# Altium footprint library pcb.PcbLib: 397 footprints (part 15 of 25)
Each footprint in its own frame and in the unit in brackets; x right, y up, seen from the top. Pads: shape width x height; smd on the part's side, far side on the other; paste and mask are expansions set on the pad; w line width, h text height; cw(c..) or ccw(c..) is an arc to the next point about the centre after c.
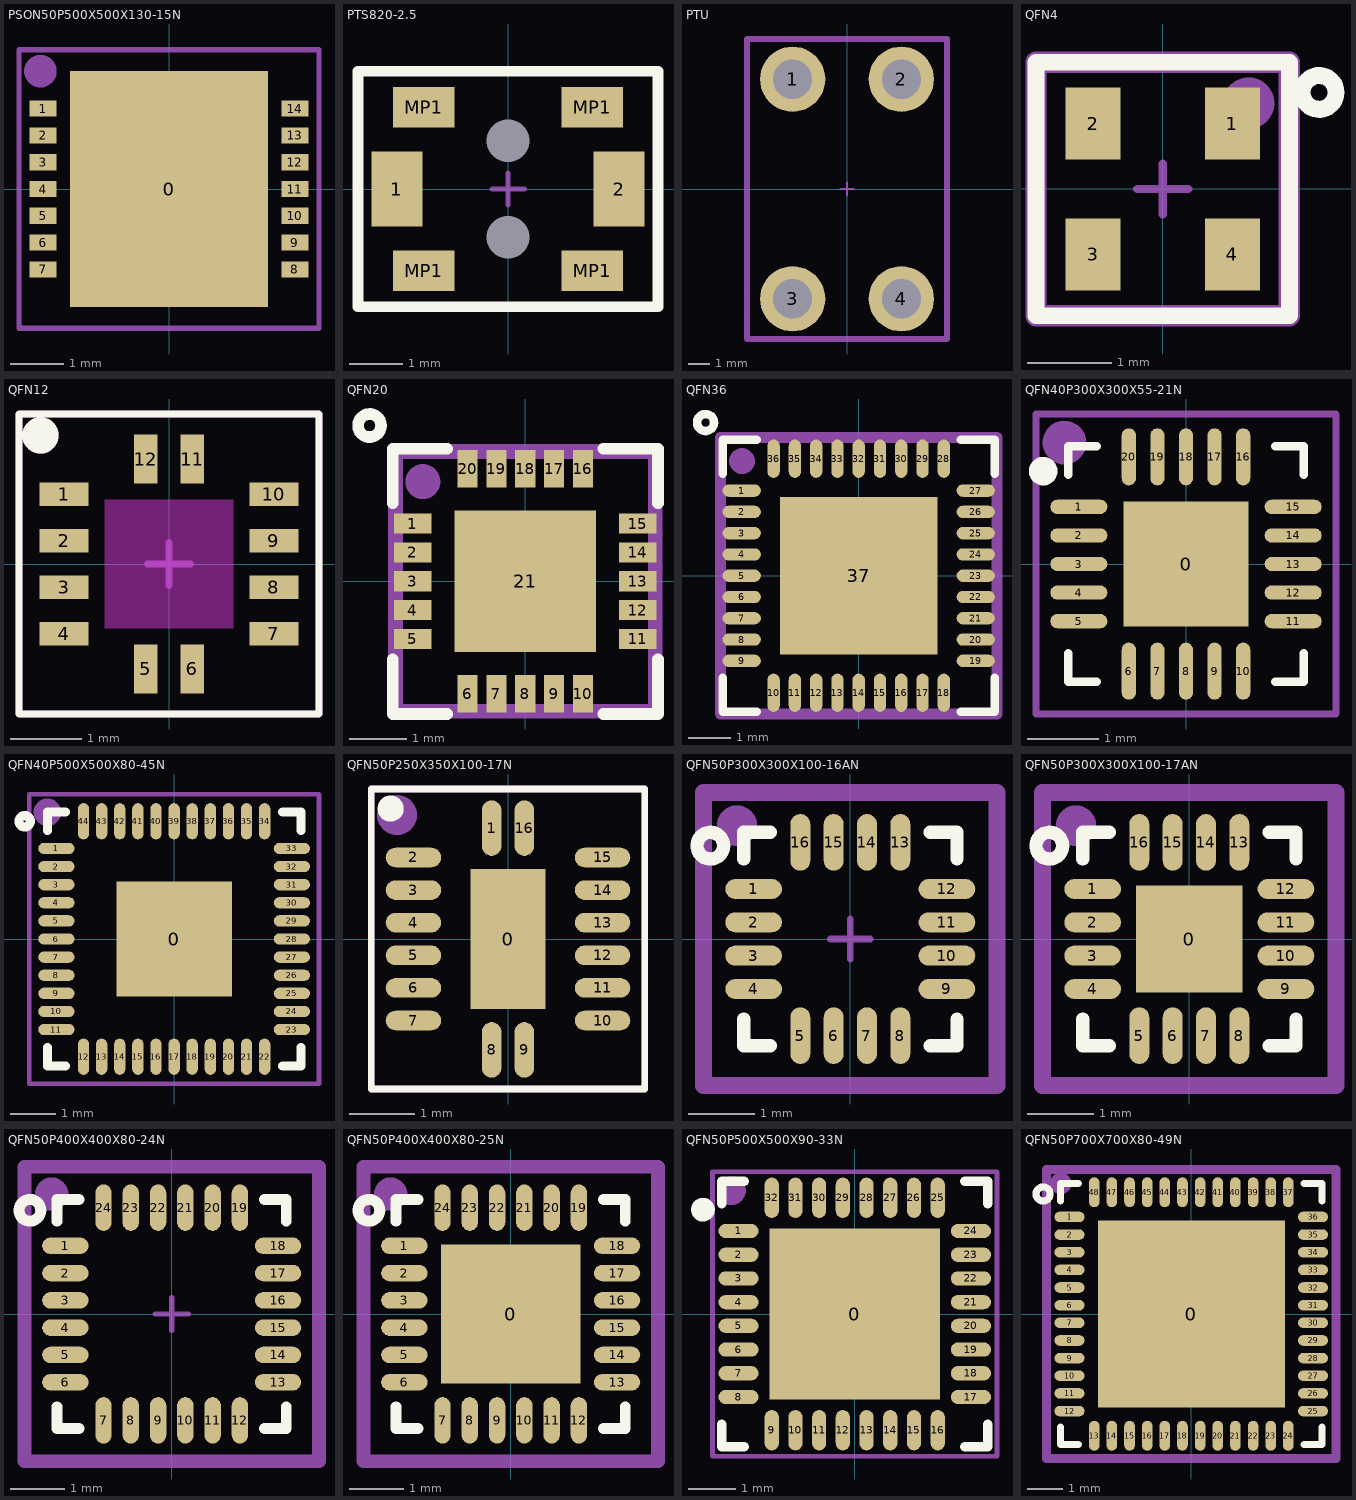
[diagram p14: the footprints below, top view; thin cyan lines are the x and y axes]

## PSON50P500X500X130-15N [mm]
height 1.3
pads (15):
  rect 3.7x4.4 smd paste-100 mask+0.07: 0(0,0)
  rect 0.5x0.3 smd paste-0.03 mask+0.05: 1(-2.35,1.5) 2(-2.35,1) 3(-2.35,0.5) 4(-2.35,0) 5(-2.35,-0.5) 6(-2.35,-1) 7(-2.35,-1.5) 8(2.35,-1.5) 9(2.35,-1) 10(2.35,-0.5) 11(2.35,0) 12(2.35,0.5) 13(2.35,1) 14(2.35,1.5)
Top Paste:
  rectangle: 0.7,-2 1.5,-0.8
  rectangle: -0.4,-2 0.4,-0.8
  rectangle: -1.5,-2 -0.7,-0.8
  rectangle: -1.5,-0.6 -0.7,0.6
  rectangle: -1.5,0.8 -0.7,2
  rectangle: -0.4,0.8 0.4,2
  rectangle: 0.7,0.8 1.5,2
  rectangle: 0.7,-0.6 1.5,0.6
  rectangle: -0.4,-0.6 0.4,0.6
Mechanical 15:
  circle w0.406: c-2.4,2.2 r0.1
  lines w0.1: -0.3,0 0.3,0 ; 0,-0.3 0,0.3 ; -2.8,-2.6 2.8,-2.6 2.8,2.6 -2.8,2.6 -2.8,-2.6
  text ".Designator" at -2.4,-2.1 h1.02
3D body: height 1.3, standoff 0, extent -2.5,-2.5 2.5,2.5

## PTS820-2.5 [mm] "Switch"
height 2.5
pads (8):
  rect 0.95x1.4 smd paste-0.03 mask+0.07: 1(-2.075,0) 2(2.075,0)
  rect 0x0 hole 0.8 paste-0.03 mask+0.07: MH(0,-0.9) MH(0,0.9)
  rect 1.15x0.75 smd paste-0.03 mask+0.07: MP1(-1.575,-1.525) MP1(-1.575,1.525) MP1(1.575,-1.525) MP1(1.575,1.525)
Top Overlay:
  lines w0.2: -2.8,-2.2 -2.8,2.2 2.8,2.2 2.8,-2.2 -2.8,-2.2
Mechanical 15:
  lines w0.1: -0.3,0 0.3,0 ; 0,-0.3 0,0.3 ; -2.8,-2.2 -2.8,2.2 2.8,2.2 2.8,-2.2 -2.8,-2.2
  text ".Designator" at -2.4,-1.9 h0.51
3D body: height 2.5, standoff 1.5, extent -0.992,-0.998 1,0.998
3D body: height 1.5, standoff 0, extent -2,-1.5 2,1.5

## PTU [mm]
height 5.2
pads (4):
  round 3 hole 1.8: 1(-2.5,5.05) 2(2.5,5.05) 3(-2.5,-5.05) 4(2.5,-5.05)
Mechanical 15:
  lines w0.1: -0.3,0 0.3,0 ; 0,-0.3 0,0.3
  lines w0.254: -4.6,-6.9 4.6,-6.9 4.6,6.9 -4.6,6.9 -4.6,-6.9
  text ".Designator" at -3.9,-2.6 h1.02
3D body: height 3.8, standoff 0, extent -4.6,-5.6 4.6,5.6

## QFN4 [mm]
height 1
pads (4):
  rect 0.65x0.85 smd paste-0.03 mask+0.07: 1(0.825,0.775) 2(-0.825,0.775) 3(-0.825,-0.775) 4(0.825,-0.775)
Top Overlay:
  circle w0.2: c1.851,1.143 r0.2
  lines w0.2: -1.5,-1.5 1.5,-1.5 1.5,1.5 -1.5,1.5 -1.5,-1.5
Mechanical 15:
  circle w0.406: c1.016,1.016 r0.102
  lines w0.1: -0.3,0 0.3,0 ; 0,-0.3 0,0.3
  lines w0.254: -1.5,-1.5 1.5,-1.5 1.5,1.5 -1.5,1.5 -1.5,-1.5
  text ".Designator" at -1.25,-1.25 h0.51
3D body: height 1, standoff 0, extent -1,-1 1,1

## QFN12 [mm]
pads (12):
  rect 0.686x0.33 smd paste-0.02 mask+0.102: 1(-1.468,0.975) 2(-1.468,0.325) 3(-1.468,-0.325) 4(-1.468,-0.975) 7(1.468,-0.975) 8(1.468,-0.325) 9(1.468,0.325) 10(1.468,0.975)
  rect 0.33x0.686 smd paste-0.02 mask+0.102: 5(-0.325,-1.468) 6(0.325,-1.468) 11(0.325,1.468) 12(-0.325,1.468)
Top Layer keep-out:
  rectangle: -0.9,-0.9 0.9,0.9
Top Overlay:
  circle w0.406: c-1.8,1.8 r0.05
  lines w0.1: -2.1,-2.1 2.1,-2.1 2.1,2.1 -2.1,2.1 -2.1,-2.1
Mechanical 15:
  circle w0.406: c-1.8,1.8 r0.05
  lines w0.1: -0.3,0 0.3,0 ; 0,-0.3 0,0.3 ; -2.1,-2.1 2.1,-2.1 2.1,2.1 -2.1,2.1 -2.1,-2.1
  text ".Designator" at -1.8,-1.7 h1.02
3D body: height 1, standoff 0, extent -1.5,-1.5 1.5,1.5

## QFN20 [mm]
height 0.8
pads (21):
  rect 0.65x0.35 smd paste-0.03 mask+0.07: 1(-1.95,1) 2(-1.95,0.5) 3(-1.95,0) 4(-1.95,-0.5) 5(-1.95,-1) 11(1.95,-1) 12(1.95,-0.5) 13(1.95,0) 14(1.95,0.5) 15(1.95,1)
  rect 0.35x0.65 smd paste-0.03 mask+0.07: 6(-1,-1.95) 7(-0.5,-1.95) 8(0,-1.95) 9(0.5,-1.95) 10(1,-1.95) 16(1,1.95) 17(0.5,1.95) 18(0,1.95) 19(-0.5,1.95) 20(-1,1.95)
  rect 2.45x2.45 smd paste-50 mask+0.1: 21(0,0)
Top Overlay:
  circle w0.2: c-2.7,2.7 r0.2
  lines w0.2: -2.3,-1.35 -2.3,-2.3 -1.35,-2.3 ; -2.3,1.35 -2.3,2.3 -1.35,2.3 ; 1.35,-2.3 2.3,-2.3 2.3,-1.35 ; 1.35,2.3 2.3,2.3 2.3,1.35
Top Paste:
  rectangle: 0.1,0.1 1.1,1.1
  rectangle: 0.1,-1.1 1.1,-0.1
  rectangle: -1.1,-1.1 -0.1,-0.1
  rectangle: -1.1,0.1 -0.1,1.1
Mechanical 15:
  circle w0.406: c-1.776,1.727 r0.1
  lines w0.1: -0.3,0 0.3,0 ; 0,-0.3 0,0.3
  lines w0.254: -2.25,-2.25 -2.25,2.25 2.25,2.25 2.25,-2.25 -2.25,-2.25
  text ".Designator" at -1.727,0.762 h1.02
3D body: height 1, standoff 0, extent -2,-2 2,2

## QFN36 [mm]
height 0.8
pads (37):
  oval 0.9x0.29 smd paste-0.03 mask+0.07: 1(-2.75,2) 2(-2.75,1.5) 3(-2.75,1) 4(-2.75,0.5) 5(-2.75,0) 6(-2.75,-0.5) 7(-2.75,-1) 8(-2.75,-1.5) 9(-2.75,-2) 19(2.75,-2) 20(2.75,-1.5) 21(2.75,-1) 22(2.75,-0.5) 23(2.75,0) 24(2.75,0.5) 25(2.75,1) 26(2.75,1.5) 27(2.75,2)
  oval 0.29x0.9 smd paste-0.03 mask+0.07: 10(-2,-2.75) 11(-1.5,-2.75) 12(-1,-2.75) 13(-0.5,-2.75) 14(0,-2.75) 15(0.5,-2.75) 16(1,-2.75) 17(1.5,-2.75) 18(2,-2.75) 28(2,2.75) 29(1.5,2.75) 30(1,2.75) 31(0.5,2.75) 32(0,2.75) 33(-0.5,2.75) 34(-1,2.75) 35(-1.5,2.75) 36(-2,2.75)
  rect 3.7x3.7 smd paste-20 mask+0.1: 37(0,0)
Top Overlay:
  circle w0.2: c-3.6,3.6 r0.2
  lines w0.2: -3.2,-2.4 -3.2,-3.2 -2.4,-3.2 ; -3.2,2.4 -3.2,3.2 ; -3.15,3.2 -2.4,3.2 ; 2.4,-3.2 3.2,-3.2 3.2,-2.4 ; 2.4,3.2 3.2,3.2 3.2,2.4
Top Paste:
  rectangle: -1.7,0.2 -0.2,1.7
  rectangle: -1.7,-1.7 -0.2,-0.2
  rectangle: 0.2,-1.7 1.7,-0.2
  rectangle: 0.2,0.2 1.7,1.7
Mechanical 15:
  circle w0.406: c-2.742,2.692 r0.1
  lines w0.1: -0.3,0 0.3,0 ; 0,-0.3 0,0.3
  lines w0.254: -3.25,-3.25 3.25,-3.25 3.25,3.25 -3.25,3.25 -3.25,-3.25
  text ".Designator" at -2.75,1.5 h1.02
3D body: height 1, standoff 0, extent -3,-3 3,3

## QFN40P300X300X55-21N [mm]
height 0.55
pads (21):
  rect 1.75x1.75 smd paste-100: 0(0,0)
  oval 0.8x0.2 smd paste-0.03 mask+0.07: 1(-1.5,0.8) 2(-1.5,0.4) 3(-1.5,0) 4(-1.5,-0.4) 5(-1.5,-0.8) 11(1.5,-0.8) 12(1.5,-0.4) 13(1.5,0) 14(1.5,0.4) 15(1.5,0.8)
  oval 0.2x0.8 smd paste-0.03 mask+0.07: 6(-0.8,-1.5) 7(-0.4,-1.5) 8(0,-1.5) 9(0.4,-1.5) 10(0.8,-1.5) 16(0.8,1.5) 17(0.4,1.5) 18(0,1.5) 19(-0.4,1.5) 20(-0.8,1.5)
Top Overlay:
  circle w0.2: c-2,1.3 r0.1
  lines w0.12: -1.65,-1.25 -1.65,-1.65 -1.25,-1.65 ; -1.65,1.25 -1.65,1.65 -1.25,1.65 ; 1.25,-1.65 1.65,-1.65 1.65,-1.25 ; 1.25,1.65 1.65,1.65 1.65,1.25
Top Paste:
  rectangle: 0.1,-0.8 0.8,-0.1
  rectangle: -0.8,-0.8 -0.1,-0.1
  rectangle: 0.1,0.1 0.8,0.8
  rectangle: -0.8,0.1 -0.1,0.8
Mechanical 15:
  circle w0.406: c-1.702,1.7 r0.102
  lines w0.1: -0.3,0 0.3,0 ; 0,-0.3 0,0.3 ; -2.1,-2.1 -2.1,2.1 2.1,2.1 2.1,-2.1 -2.1,-2.1
  text ".Designator" at -1.8,-1.8 h0.76
3D body: height 0.55, standoff 0, extent -1.5,-1.5 1.5,1.5

## QFN40P500X500X80-45N [mm]
height 0.8
pads (45):
  rect 2.55x2.55 smd paste-50: 0(0,0)
  oval 0.8x0.25 smd paste-0.03 mask+0.07: 1(-2.6,2) 2(-2.6,1.6) 3(-2.6,1.2) 4(-2.6,0.8) 5(-2.6,0.4) 6(-2.6,0) 7(-2.6,-0.4) 8(-2.6,-0.8) 9(-2.6,-1.2) 10(-2.6,-1.6) 11(-2.6,-2) 23(2.6,-2) 24(2.6,-1.6) 25(2.6,-1.2) 26(2.6,-0.8) 27(2.6,-0.4) 28(2.6,0) 29(2.6,0.4) 30(2.6,0.8) 31(2.6,1.2) 32(2.6,1.6) 33(2.6,2)
  oval 0.25x0.8 smd paste-0.03 mask+0.07: 12(-2,-2.6) 13(-1.6,-2.6) 14(-1.2,-2.6) 15(-0.8,-2.6) 16(-0.4,-2.6) 17(0,-2.6) 18(0.4,-2.6) 19(0.8,-2.6) 20(1.2,-2.6) 21(1.6,-2.6) 22(2,-2.6) 34(2,2.6) 35(1.6,2.6) 36(1.2,2.6) 37(0.8,2.6) 38(0.4,2.6) 39(0,2.6) 40(-0.4,2.6) 41(-0.8,2.6) 42(-1.2,2.6) 43(-1.6,2.6) 44(-2,2.6)
Top Overlay:
  circle w0.2: c-3.3,2.6 r0.125
  lines w0.2: -2.8,-2.4 -2.8,-2.8 -2.4,-2.8 ; -2.8,2.4 -2.8,2.8 -2.4,2.8 ; 2.4,-2.8 2.8,-2.8 2.8,-2.4 ; 2.4,2.8 2.8,2.8 2.8,2.4
Top Paste:
  region: 1.1,-0.14 0.12,-0.14 0.12,-1.1 1.1,-1.1
  rectangle: -1.08,-1.1 -0.1,-0.14
  rectangle: 0.12,0.1 1.1,1.06
  rectangle: -1.08,0.1 -0.1,1.06
Mechanical 15:
  circle w0.406: c-2.8,2.8 r0.1
  lines w0.1: -0.3,0 0.3,0 ; 0,-0.3 0,0.3 ; -3.2,-3.2 -3.2,3.2 3.2,3.2 3.2,-3.2 -3.2,-3.2
  text ".Designator" at -2.6,-2.9 h0.76
3D body: height 0.85, standoff 0, extent -2.5,-2.5 2.5,2.5

## QFN50P250X350X100-17N [mm]
height 1
pads (17):
  rect 1.15x2.15 smd paste-1000 mask+0.07: 0(0,0)
  oval 0.3x0.85 smd paste-0.03 mask+0.07: 1(-0.25,1.7) 8(-0.25,-1.7) 9(0.25,-1.7) 16(0.25,1.7)
  oval 0.85x0.3 smd paste-0.03 mask+0.07: 2(-1.45,1.25) 3(-1.45,0.75) 4(-1.45,0.25) 5(-1.45,-0.25) 6(-1.45,-0.75) 7(-1.45,-1.25) 10(1.45,-1.25) 11(1.45,-0.75) 12(1.45,-0.25) 13(1.45,0.25) 14(1.45,0.75) 15(1.45,1.25)
Top Overlay:
  circle w0.2: c-1.8,2 r0.1
  lines w0.1: -2.1,-2.3 2.1,-2.3 2.1,2.3 -2.1,2.3 -2.1,-2.3
Top Paste:
  rectangle: -0.44,0.44 0.44,1
  rectangle: -0.44,-0.28 0.44,0.28
  rectangle: -0.44,-1 0.44,-0.44
Mechanical 15:
  circle w0.406: c-1.702,1.9 r0.102
  lines w0.1: -0.3,0 0.3,0 ; 0,-0.3 0,0.3 ; -2.1,-2.3 2.1,-2.3 2.1,2.3 -2.1,2.3 -2.1,-2.3
  text ".Designator" at -1.8,-2 h0.76
3D body: height 0.85, standoff 0, extent -1.5,-1.75 1.5,1.75

## QFN50P300X300X100-16AN [mm]
height 0.8
pads (16):
  oval 0.85x0.3 smd: 1(-1.45,0.75) 2(-1.45,0.25) 3(-1.45,-0.25) 4(-1.45,-0.75) 9(1.45,-0.75) 10(1.45,-0.25) 11(1.45,0.25) 12(1.45,0.75)
  oval 0.3x0.85 smd: 5(-0.75,-1.45) 6(-0.25,-1.45) 7(0.25,-1.45) 8(0.75,-1.45) 13(0.75,1.45) 14(0.25,1.45) 15(-0.25,1.45) 16(-0.75,1.45)
Top Overlay:
  circle w0.2: c-2.1,1.4 r0.2
  lines w0.2: -1.6,-1.2 -1.6,-1.6 -1.2,-1.6 ; -1.6,1.2 -1.6,1.6 -1.2,1.6 ; 1.2,-1.6 1.6,-1.6 1.6,-1.2 ; 1.2,1.6 1.6,1.6 1.6,1.2
Mechanical 15:
  circle w0.406: c-1.7,1.7 r0.1
  lines w0.1: -0.3,0 0.3,0 ; 0,-0.3 0,0.3
  lines w0.254: -2.2,-2.2 2.2,-2.2 2.2,2.2 -2.2,2.2 -2.2,-2.2
  text ".Designator" at -1.7,-1.4 h1.02
3D body: height 0.8, standoff 0, extent -1.5,-1.5 1.5,1.5

## QFN50P300X300X100-17AN [mm]
height 0.8
pads (17):
  rect 1.6x1.6 smd paste-100: 0(0,0)
  oval 0.85x0.3 smd: 1(-1.45,0.75) 2(-1.45,0.25) 3(-1.45,-0.25) 4(-1.45,-0.75) 9(1.45,-0.75) 10(1.45,-0.25) 11(1.45,0.25) 12(1.45,0.75)
  oval 0.3x0.85 smd: 5(-0.75,-1.45) 6(-0.25,-1.45) 7(0.25,-1.45) 8(0.75,-1.45) 13(0.75,1.45) 14(0.25,1.45) 15(-0.25,1.45) 16(-0.75,1.45)
Top Overlay:
  circle w0.2: c-2.1,1.4 r0.2
  lines w0.2: -1.6,-1.2 -1.6,-1.6 -1.2,-1.6 ; -1.6,1.2 -1.6,1.6 -1.2,1.6 ; 1.2,-1.6 1.6,-1.6 1.6,-1.2 ; 1.2,1.6 1.6,1.6 1.6,1.2
Top Paste:
  rectangle: -0.7,0.1 -0.1,0.7
  rectangle: 0.1,0.1 0.7,0.7
  rectangle: -0.7,-0.7 -0.1,-0.1
  rectangle: 0.1,-0.7 0.7,-0.1
Mechanical 15:
  circle w0.406: c-1.7,1.7 r0.1
  lines w0.1: -0.3,0 0.3,0 ; 0,-0.3 0,0.3
  lines w0.254: -2.2,-2.2 2.2,-2.2 2.2,2.2 -2.2,2.2 -2.2,-2.2
  text ".Designator" at -1.7,-1.4 h1.02
3D body "RGT16_1P7X1P7.step": height 1, standoff 0, extent -1.626,-1.626 1.626,1.626

## QFN50P400X400X80-24N [mm]
height 0.8
pads (24):
  oval 0.85x0.3 smd: 1(-1.95,1.25) 2(-1.95,0.75) 3(-1.95,0.25) 4(-1.95,-0.25) 5(-1.95,-0.75) 6(-1.95,-1.25) 13(1.95,-1.25) 14(1.95,-0.75) 15(1.95,-0.25) 16(1.95,0.25) 17(1.95,0.75) 18(1.95,1.25)
  oval 0.3x0.85 smd: 7(-1.25,-1.95) 8(-0.75,-1.95) 9(-0.25,-1.95) 10(0.25,-1.95) 11(0.75,-1.95) 12(1.25,-1.95) 19(1.25,1.95) 20(0.75,1.95) 21(0.25,1.95) 22(-0.25,1.95) 23(-0.75,1.95) 24(-1.25,1.95)
Top Overlay:
  circle w0.2: c-2.6,1.9 r0.2
  lines w0.2: -2.1,-1.7 -2.1,-2.1 -1.7,-2.1 ; -2.1,1.7 -2.1,2.1 -1.7,2.1 ; 1.7,-2.1 2.1,-2.1 2.1,-1.7 ; 1.7,2.1 2.1,2.1 2.1,1.7
Mechanical 15:
  circle w0.406: c-2.2,2.2 r0.1
  lines w0.1: -0.3,0 0.3,0 ; 0,-0.3 0,0.3
  lines w0.254: -2.7,-2.7 2.7,-2.7 2.7,2.7 -2.7,2.7 -2.7,-2.7
  text ".Designator" at -2.375,-2.273 h1.02
3D body: height 0.8, standoff 0, extent -2,-2 2,2

## QFN50P400X400X80-25N [mm] "QFN,0.50mm pitch,square;24 pin,4.00mm L X 4.00mm W X 0.75mm H body (w/thermal tab)"
height 0.8
pads (25):
  rect 2.55x2.55 smd paste-5: 0(0,0)
  oval 0.85x0.3 smd: 1(-1.95,1.25) 2(-1.95,0.75) 3(-1.95,0.25) 4(-1.95,-0.25) 5(-1.95,-0.75) 6(-1.95,-1.25) 13(1.95,-1.25) 14(1.95,-0.75) 15(1.95,-0.25) 16(1.95,0.25) 17(1.95,0.75) 18(1.95,1.25)
  oval 0.3x0.85 smd: 7(-1.25,-1.95) 8(-0.75,-1.95) 9(-0.25,-1.95) 10(0.25,-1.95) 11(0.75,-1.95) 12(1.25,-1.95) 19(1.25,1.95) 20(0.75,1.95) 21(0.25,1.95) 22(-0.25,1.95) 23(-0.75,1.95) 24(-1.25,1.95)
Top Overlay:
  circle w0.2: c-2.6,1.9 r0.2
  lines w0.2: -2.1,-1.7 -2.1,-2.1 -1.7,-2.1 ; -2.1,1.7 -2.1,2.1 -1.7,2.1 ; 1.7,-2.1 2.1,-2.1 2.1,-1.7 ; 1.7,2.1 2.1,2.1 2.1,1.7
Top Paste:
  rectangle: 0.1,0.1 1.1,1.1
  rectangle: -1.1,0.1 -0.1,1.1
  rectangle: -1.1,-1.1 -0.1,-0.1
  rectangle: 0.1,-1.1 1.1,-0.1
Mechanical 15:
  circle w0.406: c-2.2,2.2 r0.1
  lines w0.1: -0.3,0 0.3,0 ; 0,-0.3 0,0.3
  lines w0.254: -2.7,-2.7 -2.7,2.7 2.7,2.7 2.7,-2.7 -2.7,-2.7
  text ".Designator" at -2.375,-2.273 h1.02
3D body: height 0.8, standoff 0, extent -2,-2 2,2

## QFN50P500X500X90-33N [mm]
height 0.9
pads (33):
  rect 3.6x3.6 smd paste-1000: 0(0,0)
  oval 0.85x0.3 smd paste-0.05 mask+0.1: 1(-2.45,1.75) 2(-2.45,1.25) 3(-2.45,0.75) 4(-2.45,0.25) 5(-2.45,-0.25) 6(-2.45,-0.75) 7(-2.45,-1.25) 8(-2.45,-1.75) 17(2.45,-1.75) 18(2.45,-1.25) 19(2.45,-0.75) 20(2.45,-0.25) 21(2.45,0.25) 22(2.45,0.75) 23(2.45,1.25) 24(2.45,1.75)
  oval 0.3x0.85 smd paste-0.05 mask+0.1: 9(-1.75,-2.45) 10(-1.25,-2.45) 11(-0.75,-2.45) 12(-0.25,-2.45) 13(0.25,-2.45) 14(0.75,-2.45) 15(1.25,-2.45) 16(1.75,-2.45) 25(1.75,2.45) 26(1.25,2.45) 27(0.75,2.45) 28(0.25,2.45) 29(-0.25,2.45) 30(-0.75,2.45) 31(-1.25,2.45) 32(-1.75,2.45)
Top Overlay:
  circle w0.25: c-3.2,2.2 r0.125
  lines w0.2: -2.8,-2.325 -2.8,-2.8 -2.325,-2.8 ; -2.8,2.325 -2.8,2.8 -2.325,2.8 ; 2.325,-2.8 2.8,-2.8 2.8,-2.325 ; 2.325,2.8 2.8,2.8 2.8,2.325
Top Paste:
  rectangle: -1.4,0.2 -0.2,1.4
  rectangle: 0.2,0.2 1.4,1.4
  rectangle: 0.2,-1.4 1.4,-0.2
  rectangle: -1.4,-1.4 -0.2,-0.2
Mechanical 15:
  circle w0.406: c-2.6,2.6 r0.1
  lines w0.1: -0.3,0 0.3,0 ; 0,-0.3 0,0.3 ; -3,-3 -3,3 3,3 3,-3 -3,-3
3D body: height 0.8, standoff 0.05, extent -2.5,-2.5 2.5,2.5

## QFN50P700X700X80-49N [mm] "QFN,0.50mm pitch,square;48 pin,7.00mm L X 7.00mm W X 0.8mm H body (w/thermal tab)"
height 0.8
pads (49):
  rect 5.3x5.3 smd paste-50: 0(0,0)
  oval 0.85x0.3 smd paste-0.03 mask+0.07: 1(-3.45,2.75) 2(-3.45,2.25) 3(-3.45,1.75) 4(-3.45,1.25) 5(-3.45,0.75) 6(-3.45,0.25) 7(-3.45,-0.25) 8(-3.45,-0.75) 9(-3.45,-1.25) 10(-3.45,-1.75) 11(-3.45,-2.25) 12(-3.45,-2.75) 25(3.45,-2.75) 26(3.45,-2.25) 27(3.45,-1.75) 28(3.45,-1.25) 29(3.45,-0.75) 30(3.45,-0.25) 31(3.45,0.25) 32(3.45,0.75) 33(3.45,1.25) 34(3.45,1.75) 35(3.45,2.25) 36(3.45,2.75)
  oval 0.3x0.85 smd paste-0.03 mask+0.07: 13(-2.75,-3.45) 14(-2.25,-3.45) 15(-1.75,-3.45) 16(-1.25,-3.45) 17(-0.75,-3.45) 18(-0.25,-3.45) 19(0.25,-3.45) 20(0.75,-3.45) 21(1.25,-3.45) 22(1.75,-3.45) 23(2.25,-3.45) 24(2.75,-3.45) 37(2.75,3.45) 38(2.25,3.45) 39(1.75,3.45) 40(1.25,3.45) 41(0.75,3.45) 42(0.25,3.45) 43(-0.25,3.45) 44(-0.75,3.45) 45(-1.25,3.45) 46(-1.75,3.45) 47(-2.25,3.45) 48(-2.75,3.45)
Top Overlay:
  circle w0.2: c-4.2,3.4 r0.2
  lines w0.2: -3.7,-3.2 -3.7,-3.7 -3.2,-3.7 ; -3.7,3.2 -3.7,3.7 -3.2,3.7 ; 3.2,-3.7 3.7,-3.7 3.7,-3.2 ; 3.2,3.7 3.7,3.7 3.7,3.2
Top Paste:
  region: -0.3,-2.3 -0.3,-0.3 -2.3,-0.3 -2.3,-2.3
  region: 2.3,-0.3 0.3,-0.3 0.3,-2.3 2.3,-2.3
  rectangle: 0.3,0.3 2.3,2.3
  rectangle: -2.3,0.3 -0.3,2.3
Mechanical 15:
  circle w0.406: c-3.7,3.7 r0.1
  lines w0.1: -0.3,0 0.3,0 ; 0,-0.3 0,0.3
  lines w0.254: -4.1,-4.1 -4.1,4.1 4.1,4.1 4.1,-4.1 -4.1,-4.1
  text ".Designator" at -2.9,-2.8 h1.02
3D body: height 0.8, standoff 0, extent -3.5,-3.5 3.5,3.5